# Altium footprint library BBC_Footprints.PcbLib: 171 footprints (part 3 of 11)
Each footprint in its own frame and in the unit in brackets; x right, y up, seen from the top. Pads: shape width x height; smd on the part's side, far side on the other; paste and mask are expansions set on the pad; w line width, h text height; cw(c..) or ccw(c..) is an arc to the next point about the centre after c.
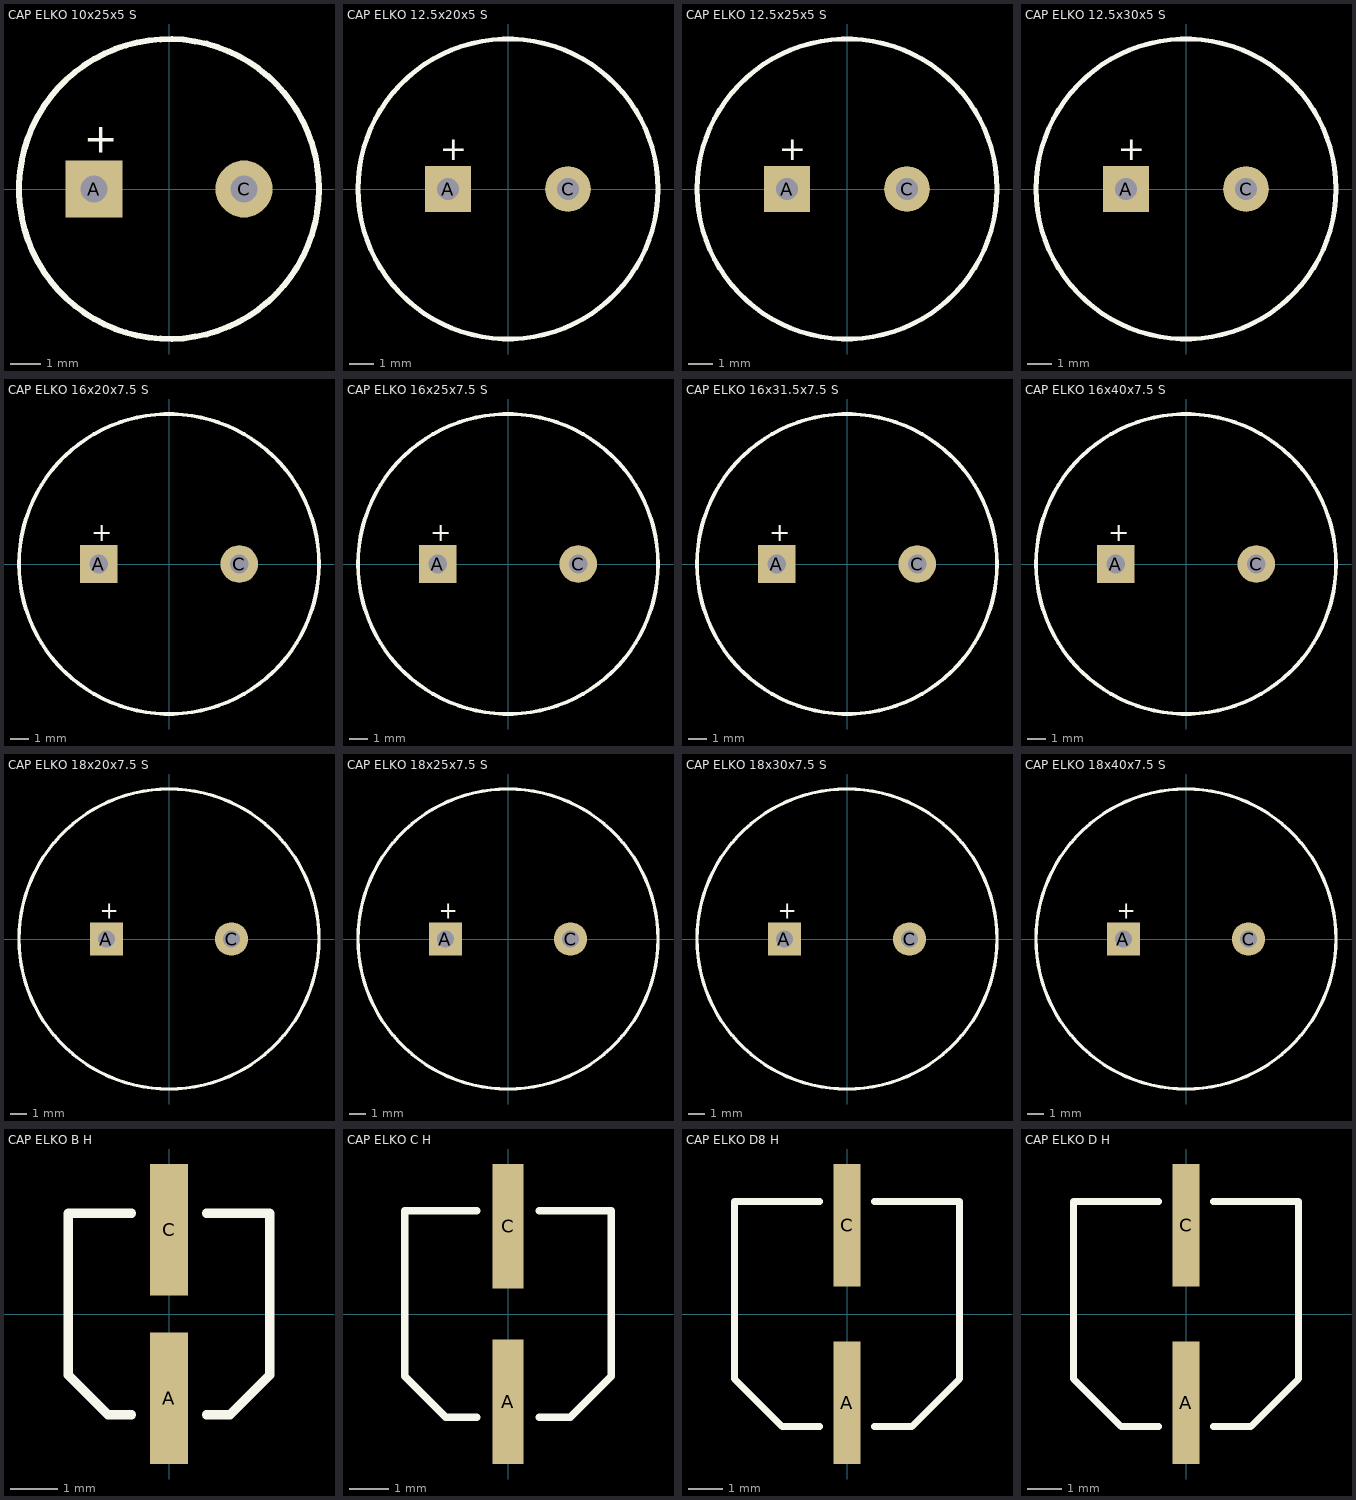
[diagram p2: the footprints below, top view; thin cyan lines are the x and y axes]

## CAP ELKO 10x25x5 S [mm] "aluminium electrolytic capacitor standing upright on the pcb / d=10, h=25, pitch = 5"
height 25
pads (2):
  rect 1.9x1.9 hole 0.9: A(-2.5,0)
  round 1.9 hole 0.9: C(2.5,0)
Top Overlay:
  circle w0.2: c0,0 r5
  text "+" at -2.85,1.2 h1
3D body "CAP ELKO 10x25x5 S.STEP": height 25.01, standoff -3, extent -5,-5 5.01,5

## CAP ELKO 12.5x20x5 S [mm] "aluminium electrolytic capacitor standing upright on the pcb / d=12.5, h=20, pitch = 5"
height 20
pads (2):
  rect 1.9x1.9 hole 0.9: A(-2.5,0)
  round 1.9 hole 0.9: C(2.5,0)
Top Overlay:
  circle w0.2: c0,0 r6.25
  text "+" at -2.85,1.2 h1
3D body "CAP ELKO 12.5x20x5 S.STEP": height 20.02, standoff -3, extent -6.25,-6.25 6.26,6.25

## CAP ELKO 12.5x25x5 S [mm] "aluminium electrolytic capacitor standing upright on the pcb / d=12.5, h=25, pitch = 5"
height 25
pads (2):
  rect 1.9x1.9 hole 0.9: A(-2.5,0)
  round 1.9 hole 0.9: C(2.5,0)
Top Overlay:
  circle w0.2: c0,0 r6.25
  text "+" at -2.85,1.2 h1
3D body "CAP ELKO 12.5x25x5 S.STEP": height 25.02, standoff -3, extent -6.25,-6.25 6.26,6.25

## CAP ELKO 12.5x30x5 S [mm] "aluminium electrolytic capacitor standing upright on the pcb / d=12.5, h=30, pitch = 5"
height 30
pads (2):
  rect 1.9x1.9 hole 0.9: A(-2.5,0)
  round 1.9 hole 0.9: C(2.5,0)
Top Overlay:
  circle w0.2: c0,0 r6.25
  text "+" at -2.85,1.2 h1
3D body "CAP ELKO 12.5x30x5 S.STEP": height 30.02, standoff -3, extent -6.25,-6.25 6.26,6.25

## CAP ELKO 16x20x7.5 S [mm] "aluminium electrolytic capacitor standing upright on the pcb / d=16, h=20, pitch = 7.5"
height 20
pads (2):
  rect 2x2 hole 1: A(-3.75,0)
  round 2 hole 1: C(3.75,0)
Top Overlay:
  circle w0.2: c0,0 r8
  text "+" at -4.15,1.2 h1
3D body "CAP ELKO 16x20x7.5 S.STEP": height 20.01, standoff -3, extent -8,-8 8.01,8

## CAP ELKO 16x25x7.5 S [mm] "aluminium electrolytic capacitor standing upright on the pcb / d=16, h=25, pitch = 7.5"
height 25
pads (2):
  rect 2x2 hole 1: A(-3.75,0)
  round 2 hole 1: C(3.75,0)
Top Overlay:
  circle w0.2: c0,0 r8
  text "+" at -4.15,1.2 h1
3D body "CAP ELKO 16x25x7.5 S.STEP": height 25.01, standoff -3, extent -8,-8 8.01,8

## CAP ELKO 16x31.5x7.5 S [mm] "aluminium electrolytic capacitor standing upright on the pcb / d=16, h=31.5, pitch = 7.5"
height 31.5
pads (2):
  rect 2x2 hole 1: A(-3.75,0)
  round 2 hole 1: C(3.75,0)
Top Overlay:
  circle w0.2: c0,0 r8
  text "+" at -4.15,1.2 h1
3D body "CAP ELKO 16x31.5x7.5 S.STEP": height 31.51, standoff -3, extent -8,-8 8.01,8

## CAP ELKO 16x40x7.5 S [mm] "aluminium electrolytic capacitor standing upright on the pcb / d=16, h=40, pitch = 7.5"
height 40
pads (2):
  rect 2x2 hole 1: A(-3.75,0)
  round 2 hole 1: C(3.75,0)
Top Overlay:
  circle w0.2: c0,0 r8
  text "+" at -4.15,1.2 h1
3D body "CAP ELKO 16x40x7.5 S.STEP": height 40.01, standoff -3, extent -8,-8 8.01,8

## CAP ELKO 18x20x7.5 S [mm] "aluminium electrolytic capacitor standing upright on the pcb / d=18, h=20, pitch = 7.5"
height 20
pads (2):
  rect 2x2 hole 1: A(-3.75,0)
  round 2 hole 1: C(3.75,0)
Top Overlay:
  circle w0.2: c0,0 r9
  text "+" at -4.15,1.2 h1
3D body "CAP ELKO 18x20x7.5 S.STEP": height 20.01, standoff -3, extent -9,-9 9.01,9

## CAP ELKO 18x25x7.5 S [mm] "aluminium electrolytic capacitor standing upright on the pcb / d=18, h=25, pitch = 7.5"
height 25
pads (2):
  rect 2x2 hole 1: A(-3.75,0)
  round 2 hole 1: C(3.75,0)
Top Overlay:
  circle w0.2: c0,0 r9
  text "+" at -4.15,1.2 h1
3D body "CAP ELKO 18x25x7.5 S.STEP": height 25.01, standoff -3, extent -9,-9 9.01,9

## CAP ELKO 18x30x7.5 S [mm] "aluminium electrolytic capacitor standing upright on the pcb / d=18, h=30, pitch = 7.5"
height 30
pads (2):
  rect 2x2 hole 1: A(-3.75,0)
  round 2 hole 1: C(3.75,0)
Top Overlay:
  circle w0.2: c0,0 r9
  text "+" at -4.15,1.2 h1
3D body "CAP ELKO 18x30x7.5 S.STEP": height 30.01, standoff -3, extent -9,-9 9.01,9

## CAP ELKO 18x40x7.5 S [mm] "aluminium electrolytic capacitor standing upright on the pcb / d=18, h=40, pitch = 7.5"
height 40
pads (2):
  rect 2x2 hole 1: A(-3.75,0)
  round 2 hole 1: C(3.75,0)
Top Overlay:
  circle w0.2: c0,0 r9
  text "+" at -4.15,1.2 h1
3D body "CAP ELKO 18x40x7.5 S.STEP": height 40.01, standoff -3, extent -9,-9 9.01,9

## CAP ELKO B H [mm] "aluminium electrolytic capacitor surface mount case B"
height 5.8
pads (2):
  rect 0.8x2.8 smd: A(0,-1.8) C(0,1.8)
Top Overlay:
  lines w0.2: -0.8,-2.15 -1.3,-2.15 -2.15,-1.3 -2.15,2.15 -0.8,2.15 ; 0.8,-2.15 1.3,-2.15 2.15,-1.3 2.15,2.15 0.8,2.15
3D body "CAP ELKO B.step": height 5.41, standoff -0.01, extent -2.15,-2.3 2.15,2.3

## CAP ELKO C H [mm] "aluminium electrolytic capacitor surface mount case C"
height 5.8
pads (2):
  rect 0.8x3.2 smd: A(0,-2.25) C(0,2.25)
Top Overlay:
  lines w0.2: -0.8,-2.65 -1.6,-2.65 -2.65,-1.6 -2.65,2.65 -0.8,2.65 ; 0.8,-2.65 1.6,-2.65 2.65,-1.6 2.65,2.65 0.8,2.65
3D body "CAP ELKO C.step": height 5.41, standoff -0.01, extent -2.65,-2.95 2.65,2.95

## CAP ELKO D8 H [mm] "aluminium electrolytic capacitor surface mount case D8"
height 7.7
pads (2):
  rect 0.8x3.6 smd: A(0,-2.6) C(0,2.6)
Top Overlay:
  lines w0.2: -0.8,-3.3 -1.9,-3.3 -3.3,-1.9 -3.3,3.3 -0.8,3.3 ; 0.8,-3.3 1.9,-3.3 3.3,-1.9 3.3,3.3 0.8,3.3
3D body "CAP ELKO D8.step": height 7.71, standoff -0.01, extent -3.3,-3.5 3.3,3.5

## CAP ELKO D H [mm] "aluminium electrolytic capacitor surface mount case D"
height 5.8
pads (2):
  rect 0.8x3.6 smd: A(0,-2.6) C(0,2.6)
Top Overlay:
  lines w0.2: -0.8,-3.3 -1.9,-3.3 -3.3,-1.9 -3.3,3.3 -0.8,3.3 ; 0.8,-3.3 1.9,-3.3 3.3,-1.9 3.3,3.3 0.8,3.3
3D body "CAP ELKO D.step": height 5.41, standoff -0.01, extent -3.3,-3.5 3.3,3.5